# Altium footprint library GRID.PcbLib: 59 footprints (part 2 of 4)
Each footprint in its own frame and in the unit in brackets; x right, y up, seen from the top. Pads: shape width x height; smd on the part's side, far side on the other; paste and mask are expansions set on the pad; w line width, h text height; cw(c..) or ccw(c..) is an arc to the next point about the centre after c.
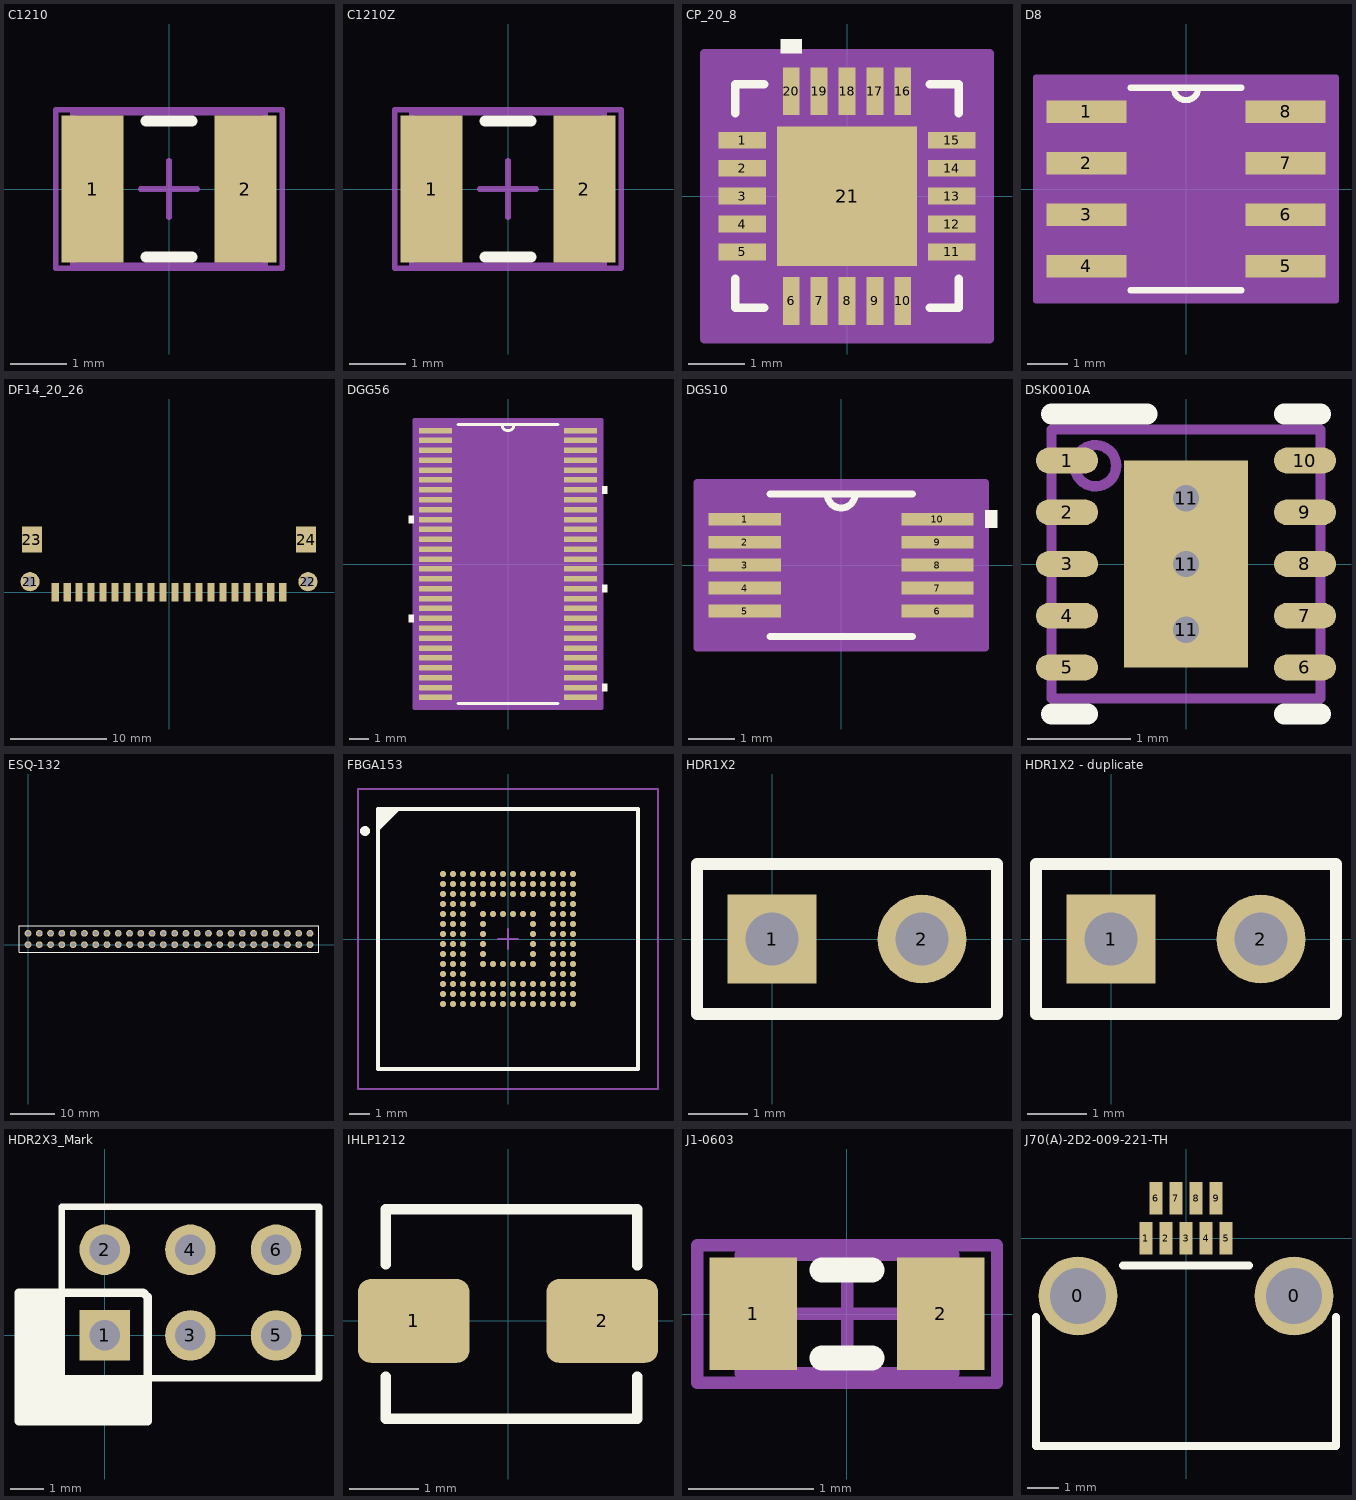
[diagram p1: the footprints below, top view; thin cyan lines are the x and y axes]

## C1210 [mm] "Chip Capacitor, Body 3.2x2.5mm, IPC High Density"
height 1.3
pads (2):
  rect 1.1x2.6 smd: 1(-1.35,0) 2(1.35,0)
Top Overlay:
  lines w0.2: -0.4,-1.2 0.4,-1.2 ; -0.4,1.2 0.4,1.2
Mechanical 13:
  lines w0.1: -1.7,-1.35 1.7,-1.35 1.7,1.35 -1.7,1.35 -1.7,-1.35
Mechanical 15:
  lines w0.1: -0.5,0 0.5,0 ; 0,-0.5 0,0.5 ; -2,-1.4 2,-1.4 2,1.4 -2,1.4 -2,-1.4
3D body: height 1.3, standoff 0, extent -1.7,-1.35 1.7,1.35

## C1210Z [mm] "Chip Capacitor, Body 3.2x2.5mm, IPC High Density"
height 1.3
pads (2):
  rect 1.1x2.6 smd: 1(-1.35,0) 2(1.35,0)
Top Overlay:
  lines w0.2: -0.4,-1.2 0.4,-1.2 ; -0.4,1.2 0.4,1.2
Mechanical 13:
  lines w0.1: -1.7,-1.35 -1.7,1.35 1.7,1.35 1.7,-1.35 -1.7,-1.35
Mechanical 15:
  lines w0.1: -0.5,0 0.5,0 ; 0,-0.5 0,0.5 ; -2,-1.4 -2,1.4 2,1.4 2,-1.4 -2,-1.4
3D body: height 1.3, standoff 0, extent -1.7,-1.35 1.7,1.35

## CP_20_8 [mm]
pads (21):
  rect 0.855x0.3 smd: 1(-1.877,1) 2(-1.877,0.5) 3(-1.877,0) 4(-1.877,-0.5) 5(-1.877,-1) 11(1.877,-1) 12(1.877,-0.5) 13(1.877,0) 14(1.877,0.5) 15(1.877,1)
  rect 0.3x0.855 smd: 6(-1,-1.877) 7(-0.5,-1.877) 8(0,-1.877) 9(0.5,-1.877) 10(1,-1.877) 16(1,1.877) 17(0.5,1.877) 18(0,1.877) 19(-0.5,1.877) 20(-1,1.877)
  rect 2.5x2.5 smd paste-1.287: 21(0,0)
Top Overlay:
  region: -0.81,2.559 -1.191,2.559 -1.191,2.813 -0.81,2.813
  lines w0.152: -2,-1.483 -2,-2 -1.483,-2 ; -2,1.483 -2,2 -1.483,2 ; 1.483,-2 2,-2 2,-1.483 ; 1.483,2 2,2 2,1.483
Mechanical 13:
  lines w0.025: -2,0.73 -0.73,2 ; -2,-2 -2,2 2,2 2,-2 -2,-2 ; -2,-1.15 -2,-0.85 -2,-1.15 ; -2,-0.65 -2,-0.35 -2,-0.65 ; -2,-0.15 -2,0.15 -2,-0.15 ; -2,0.35 -2,0.65 -2,0.35 ; -2,0.85 -2,1.15 -2,0.85 ; -1.15,-2 -0.85,-2 -1.15,-2 ; -1.15,2 -0.85,2 -1.15,2 ; -0.65,-2 -0.35,-2 -0.65,-2 ; -0.65,2 -0.35,2 -0.65,2 ; -0.15,-2 0.15,-2 -0.15,-2 ; -0.15,2 0.15,2 -0.15,2 ; 0.35,-2 0.65,-2 0.35,-2 ; 0.35,2 0.65,2 0.35,2 ; 0.85,-2 1.15,-2 0.85,-2 ; 0.85,2 1.15,2 0.85,2 ; 2,-1.15 2,-0.85 2,-1.15 ; 2,-0.65 2,-0.35 2,-0.65 ; 2,-0.15 2,0.15 2,-0.15 ; 2,0.35 2,0.65 2,0.35 ; 2,0.85 2,1.15 2,0.85
Mechanical 15:
  region: 2.559,-2.559 -2.559,-2.559 -2.559,2.559 2.559,2.559
  lines w0.152: -2.559,-2.559 2.559,-2.559 2.559,2.559 -2.559,2.559 -2.559,-2.559
3D body: height 0.25, standoff 0, extent 0,0 0.254,0.254

## D8 [mil]
pads (8):
  rect 78x22 smd: 1(-97,75) 2(-97,25) 3(-97,-25) 4(-97,-75) 5(97,-75) 6(97,-25) 7(97,25) 8(97,75)
Top Overlay:
  lines w6: -54.08,-98.5 54.08,-98.5 ; -54.08,98.5 54.08,98.5 ; -12,98.5 ccw(c0,98.5) 12,98.5
Mechanical 13:
  lines w0: -12,98.5 ccw(c0,98.5) 12,98.5
Mechanical 15:
  region: 146,-108.5 -146,-108.5 -146,108.5 146,108.5
  lines w6: -146,-108.5 146,-108.5 146,108.5 -146,108.5 -146,-108.5
3D body "D8.stp": height 69.1, standoff 0, extent -122,-98.5 122,98.5

## DF14_20_26 [mm]
pads (24):
  rect 0.75x1.9 smd: 1(-11.875,0) 2(-10.625,0) 3(-9.375,0) 4(-8.125,0) 5(-6.875,0) 6(-5.625,0) 7(-4.375,0) 8(-3.125,0) 9(-1.875,0) 10(-0.625,0) 11(0.625,0) 12(1.875,0) 13(3.125,0) 14(4.375,0) 15(5.625,0) 16(6.875,0) 17(8.125,0) 18(9.375,0) 19(10.625,0) 20(11.875,0)
  round 2 hole 1.1: 21(-14.5,1.1) 22(14.5,1.1)
  rect 2.1x2.7 smd: 23(-14.3,5.5) 24(14.3,5.5)
3D body "DF14-20P-1.25H.stp": height 2.5, standoff -0.6, extent -14.975,-0.477 14.975,6.223

## DGG56 [mil]
pads (56):
  rect 66x11 smd: 1(-144.5,265.75) 2(-144.5,246.06) 3(-144.5,226.38) 4(-144.5,206.69) 5(-144.5,187.01) 6(-144.5,167.32) 7(-144.5,147.64) 8(-144.5,127.95) 9(-144.5,108.27) 10(-144.5,88.58) 11(-144.5,68.9) 12(-144.5,49.21) 13(-144.5,29.53) 14(-144.5,9.84) 15(-144.5,-9.84) 16(-144.5,-29.53) 17(-144.5,-49.21) 18(-144.5,-68.9) 19(-144.5,-88.58) 20(-144.5,-108.27) 21(-144.5,-127.95) 22(-144.5,-147.64) 23(-144.5,-167.32) 24(-144.5,-187.01) 25(-144.5,-206.69) 26(-144.5,-226.38) 27(-144.5,-246.06) 28(-144.5,-265.75) 29(144.5,-265.75) 30(144.5,-246.06) 31(144.5,-226.38) 32(144.5,-206.69) 33(144.5,-187.01) 34(144.5,-167.32) 35(144.5,-147.64) 36(144.5,-127.95) 37(144.5,-108.27) 38(144.5,-88.58) 39(144.5,-68.9) 40(144.5,-49.21) 41(144.5,-29.53) 42(144.5,-9.84) 43(144.5,9.84) 44(144.5,29.53) 45(144.5,49.21) 46(144.5,68.9) 47(144.5,88.58) 48(144.5,108.27) 49(144.5,127.95) 50(144.5,147.64) 51(144.5,167.32) 52(144.5,187.01) 53(144.5,206.69) 54(144.5,226.38) 55(144.5,246.06) 56(144.5,265.75)
Top Overlay:
  region: -187.5,96.08 -197.5,96.08 -197.5,81.08 -187.5,81.08
  region: -187.5,-100.77 -197.5,-100.77 -197.5,-115.77 -187.5,-115.77
  region: 187.5,-238.56 197.5,-238.56 197.5,-253.56 187.5,-253.56
  region: 187.5,-41.71 197.5,-41.71 197.5,-56.71 187.5,-56.71
  region: 187.5,155.14 197.5,155.14 197.5,140.14 187.5,140.14
  lines w6: -99.99,-277.5 99.99,-277.5 ; -99.99,277.5 99.99,277.5 ; -12,277.5 ccw(c0,277.5) 12,277.5
Mechanical 13:
  lines w0: -12,277.5 ccw(c0,277.5) 12,277.5
Mechanical 15:
  region: 187.5,-287.5 -187.5,-287.5 -187.5,287.5 187.5,287.5
  lines w6: -187.5,-287.5 -187.5,287.5 187.5,287.5 187.5,-287.5 -187.5,-287.5
3D body "DGG56.stp": height 47.1, standoff 0, extent -163.5,-277.5 163.5,277.5

## DGS10 [mil]
pads (10):
  rect 62x11 smd: 1(-82.5,39.37) 2(-82.5,19.68) 3(-82.5,0) 4(-82.5,-19.68) 5(-82.5,-39.37) 6(82.5,-39.37) 7(82.5,-19.68) 8(82.5,0) 9(82.5,19.68) 10(82.5,39.37)
Top Overlay:
  region: 123.5,46.87 133.5,46.87 133.5,31.87 123.5,31.87
  lines w6: -61,-61 61,-61 ; -61,61 61,61 ; -12,61 ccw(c0,61) 12,61
Mechanical 13:
  lines w0: -12,61 ccw(c0,61) 12,61
Mechanical 15:
  region: 123.5,-71 -123.5,-71 -123.5,71 123.5,71
  lines w6: -123.5,-71 123.5,-71 123.5,71 -123.5,71 -123.5,-71
3D body "DGS10.stp": height 43.1, standoff 0, extent -99.5,-61 99.5,61

## DSK0010A [mm]
pads (14):
  oval 0.6x0.25 smd paste+0 mask+0: 1(-1.15,1) 2(-1.15,0.5) 3(-1.15,0) 4(-1.15,-0.5) 5(-1.15,-1) 6(1.15,-1) 7(1.15,-0.5) 8(1.15,0) 9(1.15,0.5) 10(1.15,1)
  round 0.457 hole 0.254: 11(0,-0.635) 11(0,0) 11(0,0.635)
  rect 1.2x2 smd paste-0.6 mask+0: 11(0,0)
Top Overlay:
  lines w0.2: -1.3,-1.45 -0.95,-1.45 ; -1.3,1.45 -0.375,1.45 ; 0.95,-1.45 1.3,-1.45 ; 0.95,1.45 1.3,1.45
Top Paste:
  region: -0.563,0.895 -0.563,-0.894 0.563,-0.894 0.563,0.895
Top Solder:
  region: 0.663,0.594 -0.663,0.594 -0.663,1.064 0.663,1.064
  region: 0.663,-0.194 -0.663,-0.194 -0.663,0.194 0.663,0.194
  region: 0.663,-1.064 -0.663,-1.064 -0.663,-0.594 0.663,-0.594
  region: -0.2,-1.064 -0.663,-1.064 -0.663,1.064 -0.2,1.064
  region: 0.663,-1.064 0.2,-1.064 0.2,1.064 0.663,1.064
  region: 0,1
  region: 0,-1
Mechanical 13:
  circle w0.1: c-0.875,0.95 r0.2
  lines w0.1: -1.3,-1.3 1.3,-1.3 1.3,1.3 -1.3,1.3 -1.3,-1.3

## ESQ-132 [mil]
pads (52):
  round 60 hole 40 mask+3: 1(0,0) 2(0,100) 3(100,0) 4(100,100) 5(200,0) 6(200,100) 7(300,0) 8(300,100) 9(400,0) 10(400,100) 11(500,0) 12(500,100) 13(600,0) 14(600,100) 15(700,0) 16(700,100) 17(800,0) 18(800,100) 19(900,0) 20(900,100) 21(1000,0) 22(1000,100) 23(1100,0) 24(1100,100) 25(1200,0) 26(1200,100) 27(1300,0) 28(1300,100) 29(1400,0) 30(1400,100) 31(1500,0) 32(1500,100) 33(1600,0) 34(1600,100) 35(1700,0) 36(1700,100) 37(1800,0) 38(1800,100) 39(1900,0) 40(1900,100) 41(2000,0) 42(2000,100) 43(2100,0) 44(2100,100) 45(2200,0) 46(2200,100) 47(2300,0) 48(2300,100) 49(2400,0) 50(2400,100) 51(2500,0) 52(2500,100)
Top Overlay:
  lines w10: -80,-67.5 -80,167.5 2580,167.5 2580,-67.5 -80,-67.5

## FBGA153 [mm]
pads (153):
  round 0.3 smd: A1(-3.25,3.25) A2(-2.75,3.25) A3(-2.25,3.25) A4(-1.75,3.25) A5(-1.25,3.25) A6(-0.75,3.25) A7(-0.25,3.25) A8(0.25,3.25) A9(0.75,3.25) A10(1.25,3.25) A11(1.75,3.25) A12\(2.25,3.25) A13(2.75,3.25) A14(3.25,3.25) B1(-3.25,2.75) B2(-2.75,2.75) B3(-2.25,2.75) B4(-1.75,2.75) B5(-1.25,2.75) B6(-0.75,2.75) B7(-0.25,2.75) B8(0.25,2.75) B9(0.75,2.75) B10(1.25,2.75) B11(1.75,2.75) B12(2.25,2.75) B13(2.75,2.75) B14(3.25,2.75) C1(-3.25,2.25) C2(-2.75,2.25) C3(-2.25,2.25) C4(-1.75,2.25) C5(-1.25,2.25) C6(-0.75,2.25) C7(-0.25,2.25) C8(0.25,2.25) C9(0.75,2.25) C10(1.25,2.25) C11(1.75,2.25) C12(2.25,2.25) C13(2.75,2.25) C14(3.25,2.25) D1(-3.25,1.75) D2(-2.75,1.75) D3(-2.25,1.75) D4(-1.75,1.75) D12(2.25,1.75) D13(2.75,1.75) D14(3.25,1.75) E1(-3.25,1.25) E2(-2.75,1.25) E3(-2.25,1.25) E5(-1.25,1.25) E6(-0.75,1.25) E7(-0.25,1.25) E8(0.25,1.25) E9(0.75,1.25) E10(1.25,1.25) E12(2.25,1.25) E13(2.75,1.25) E14(3.25,1.25) F1(-3.25,0.75) F2(-2.75,0.75) F3(-2.25,0.75) F5(-1.25,0.75) F10(1.25,0.75) F12(2.25,0.75) F13(2.75,0.75) F14(3.25,0.75) G1(-3.25,0.25) G2(-2.75,0.25) G3(-2.25,0.25) G5(-1.25,0.25) G10(1.25,0.25) G12(2.25,0.25) G13(2.75,0.25) G14(3.25,0.25) H1(-3.25,-0.25) H2(-2.75,-0.25) H3(-2.25,-0.25) H5(-1.25,-0.25) H10(1.25,-0.25) H12(2.25,-0.25) H13(2.75,-0.25) H14(3.25,-0.25) J1(-3.25,-0.75) J2(-2.75,-0.75) J3(-2.25,-0.75) J5(-1.25,-0.75) J10(1.25,-0.75) J12(2.25,-0.75) J13(2.75,-0.75) J14(3.25,-0.75) K1(-3.25,-1.25) K2(-2.75,-1.25) K3(-2.25,-1.25) K5(-1.25,-1.25) K6(-0.75,-1.25) K7(-0.25,-1.25) K8(0.25,-1.25) K9(0.75,-1.25) K10(1.25,-1.25) K12(2.25,-1.25) K13(2.75,-1.25) K14(3.25,-1.25) L1(-3.25,-1.75) L2(-2.75,-1.75) L3(-2.25,-1.75) L12(2.25,-1.75) L13(2.75,-1.75) L14(3.25,-1.75) M1(-3.25,-2.25) M2(-2.75,-2.25) M3(-2.25,-2.25) M4(-1.75,-2.25) M5(-1.25,-2.25) M6(-0.75,-2.25) M7(-0.25,-2.25) M8(0.25,-2.25) M9(0.75,-2.25) M10(1.25,-2.25) M11(1.75,-2.25) M12(2.25,-2.25) M13(2.75,-2.25) M14(3.25,-2.25) N1(-3.25,-2.75) N2(-2.75,-2.75) N3(-2.25,-2.75) N4(-1.75,-2.75) N5(-1.25,-2.75) N6(-0.75,-2.75) N7(-0.25,-2.75) N8(0.25,-2.75) N9(0.75,-2.75) N10(1.25,-2.75) N11(1.75,-2.75) N12(2.25,-2.75) N13(2.75,-2.75) N14(3.25,-2.75) P1(-3.25,-3.25) P2(-2.75,-3.25) P3(-2.25,-3.25) P4(-1.75,-3.25) P5(-1.25,-3.25) P6(-0.75,-3.25) P7(-0.25,-3.25) P8(0.25,-3.25) P9(0.75,-3.25) P10(1.25,-3.25) P11(1.75,-3.25) P12(2.25,-3.25) P13(2.75,-3.25) P14(3.25,-3.25)
Top Overlay:
  circle w0.25: c-7.15,5.4 r0.125
  region: -5.52,6.494 -6.52,5.494 -6.52,6.494
  lines w0.2: -6.5,5.5 -5.5,6.5 ; -6.5,-6.5 6.5,-6.5 6.5,6.5 -6.5,6.5 -6.5,-6.5
Mechanical 13:
  lines w0.1: -6.5,-6.5 6.5,-6.5 6.5,6.5 -6.5,6.5 -6.5,-6.5
Mechanical 15:
  lines w0.1: -0.5,0 0.5,0 ; 0,-0.5 0,0.5 ; -7.5,-7.5 7.5,-7.5 7.5,7.5 -7.5,7.5 -7.5,-7.5

## HDR1X2 [mm] "Connector; Header; 2 Position"
height 0.305
pads (2):
  rect 1.5x1.5 hole 0.9: 1(0,0)
  round 1.5 hole 0.9: 2(2.54,0)
Top Overlay:
  lines w0.2: -1.27,-1.27 3.81,-1.27 3.81,1.27 -1.27,1.27 -1.27,-1.27

## HDR1X2 - duplicate [mm] "Connector; Header; 2 Position"
height 0.305
pads (2):
  rect 1.5x1.5 hole 0.9: 1(0,0)
  round 1.5 hole 0.9: 2(2.54,0)
Top Overlay:
  lines w0.2: -1.27,-1.27 3.81,-1.27 3.81,1.27 -1.27,1.27 -1.27,-1.27

## HDR2X3_Mark [mm]
pads (6):
  rect 1.5x1.5 hole 0.9: 1(0,0)
  round 1.5 hole 0.9: 2(0,2.54) 3(2.54,0) 4(2.54,2.54) 5(5.08,0) 6(5.08,2.54)
Top Overlay:
  rectangle: -2.54,-2.54 -1.27,1.27
  rectangle: -2.54,-2.54 1.27,-1.27
  lines w0.2: 1.482,-1.27 6.35,-1.27 ; 6.35,-1.27 6.35,3.81 -1.27,3.81 -1.27,-1.27 6.35,-1.27
  lines w0.254: -2.54,-2.54 -2.54,1.27 1.143,1.27 1.27,1.143 1.27,-2.54 -2.54,-2.54
3D body "TSW-103-08-X-D.STEP": height 6.98, standoff -6.48, extent -1.27,-1.27 6.35,3.81

## IHLP1212 [mm]
pads (2):
  rrect30% 1.6x1.2 smd: 1(-1.35,0) 2(1.35,0)
Top Overlay:
  lines w0.152: -1.75,-0.8 -1.75,-1.4 1.85,-1.4 1.85,-0.8 ; -1.75,0.811 -1.75,1.6 1.85,1.6 1.85,0.8
3D body "User Library-IHLP1212.STEP": height 2.01, standoff -0.03, extent -1.779,-1.397 1.879,1.6

## J1-0603 [mm] "Chip Resistor, Body 1.6x0.8mm, IPC High Density"
height 0.9
pads (2):
  rect 0.7x0.9 smd: 1(-0.75,0) 2(0.75,0)
Top Overlay:
  lines w0.2: -0.2,-0.35 0.2,-0.35 ; -0.2,0.35 0.2,0.35
Mechanical 13:
  lines w0.1: -0.85,-0.475 0.85,-0.475 0.85,0.475 -0.85,0.475 -0.85,-0.475
Mechanical 15:
  lines w0.1: -0.475,0 0.475,0 ; 0,-0.475 0,0.475 ; -1.2,-0.55 1.2,-0.55 1.2,0.55 -1.2,0.55 -1.2,-0.55
3D body: height 0.9, standoff 0, extent -0.85,-0.475 0.85,0.475

## J70(A)-2D2-009-221-TH [mm]
pads (11):
  round 2.5 hole 1.78: 0(-3.43,-1.83) 0(3.43,-1.83)
  rect 0.4x1.02 smd: 1(-1.27,0) 2(-0.635,0) 3(0,0) 4(0.635,0) 5(1.27,0) 6(-0.953,1.27) 7(-0.318,1.27) 8(0.318,1.27) 9(0.953,1.27)
Top Overlay:
  lines w0.254: -4.76,-2.5 -4.76,-6.59 4.76,-6.59 4.76,-2.5 ; -2,-0.87 2,-0.87